# Altium footprint library Miscellaneous Devices LC.PcbLib: 733 footprints (part 46 of 46)
Each footprint in its own frame and in the unit in brackets; x right, y up, seen from the top. Pads: shape width x height; smd on the part's side, far side on the other; paste and mask are expansions set on the pad; w line width, h text height; cw(c..) or ccw(c..) is an arc to the next point about the centre after c.
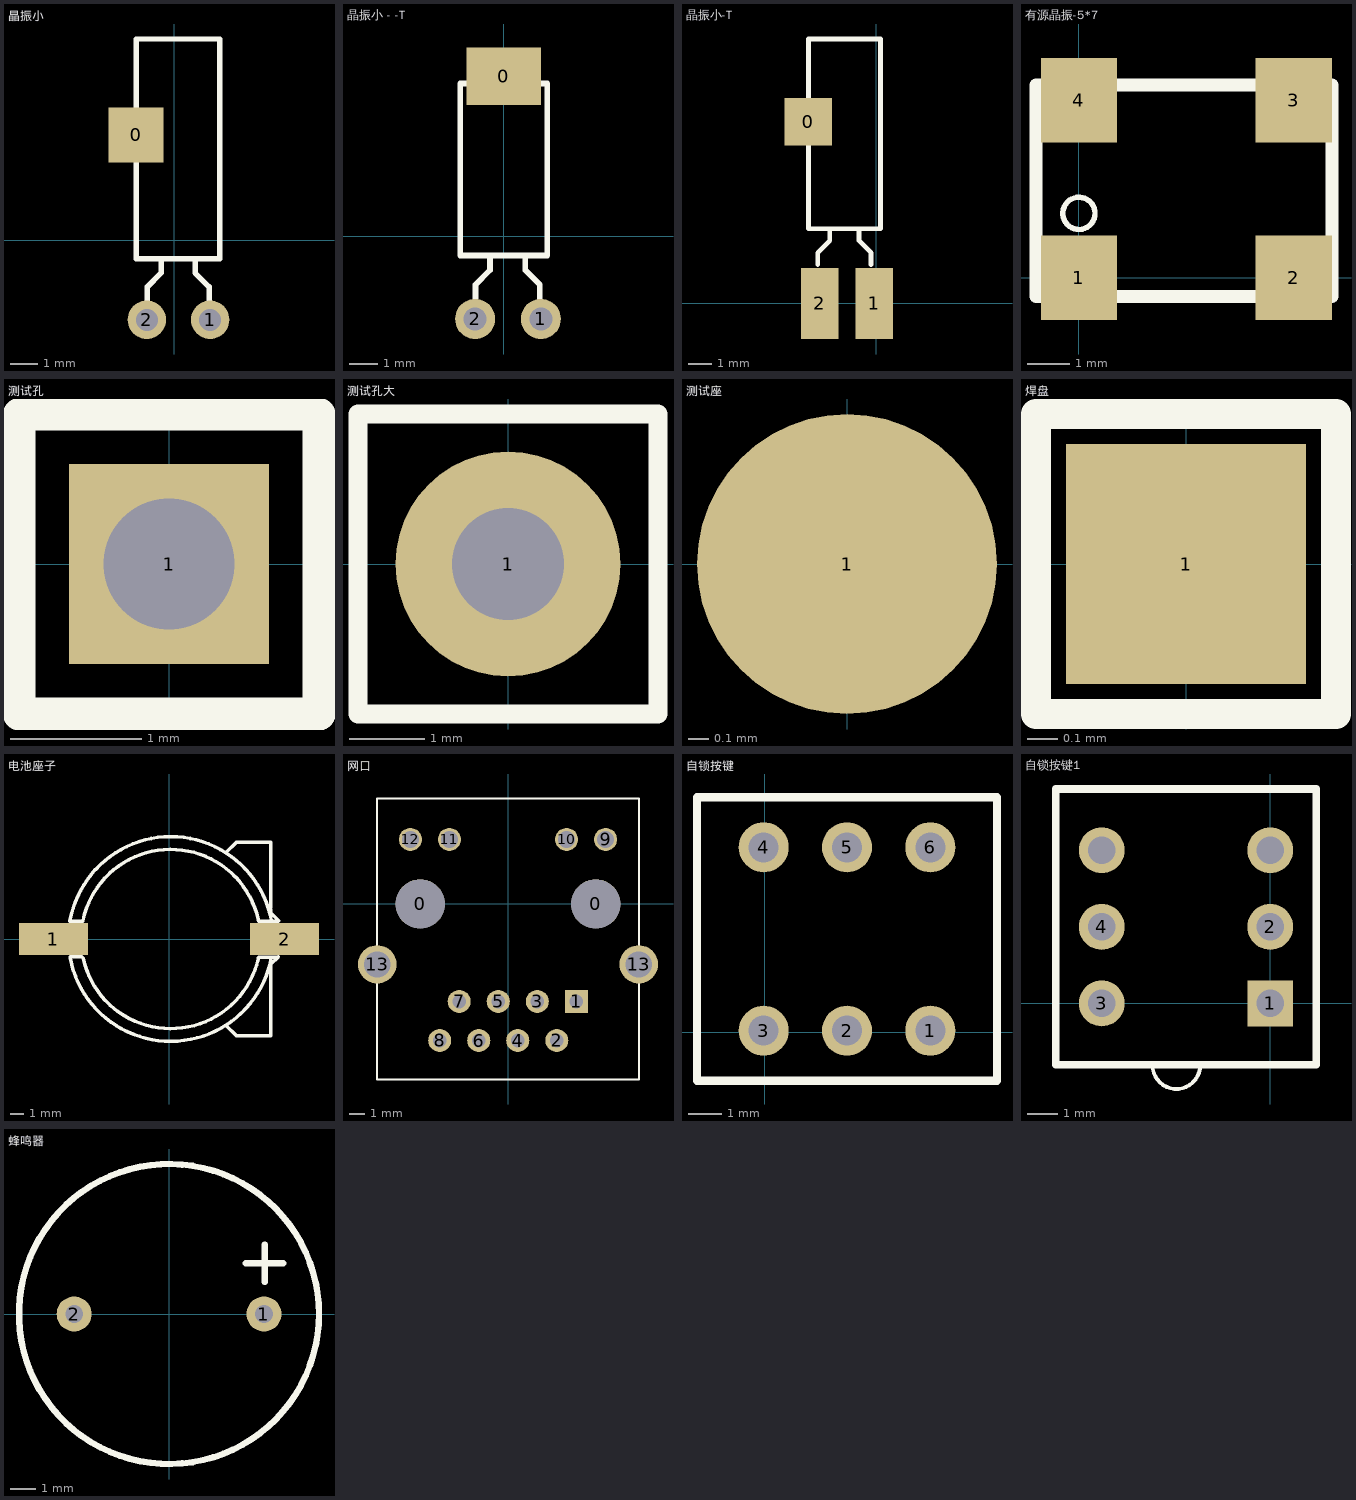
[diagram p45: the footprints below, top view; thin cyan lines are the x and y axes]

## 晶振小 [mm]
pads (3):
  rect 2x2 smd: 0(-1.39,3.829)
  round 1.4 hole 0.8: 1(1.3,-2.9) 2(-1,-2.9)
Top Overlay:
  lines w0.2: -0.987,-2.184 -0.987,-1.7 -0.479,-1.192 -0.479,-0.682 ; 1.263,-2.184 1.263,-1.7 0.755,-1.192 0.755,-0.682 ; -0.479,-0.682 0.755,-0.682 ; -0.479,-0.682 -1.379,-0.682 -1.379,7.318 1.655,7.318 1.655,-0.682 0.755,-0.682

## 晶振小 - -T [mm]
pads (3):
  rect 2.6x2 smd: 0(0,5.588)
  round 1.4 hole 0.8: 1(1.3,-2.9) 2(-1,-2.9)
Top Overlay:
  lines w0.2: -0.987,-2.184 -0.987,-1.7 -0.479,-1.192 -0.479,-0.682 ; 1.263,-2.184 1.263,-1.7 0.755,-1.192 0.755,-0.682 ; -0.479,-0.682 -1.524,-0.682 -1.524,5.334 1.524,5.334 1.524,-0.682 0.755,-0.682 ; -0.479,-0.682 0.755,-0.682

## 晶振小-T [mm]
pads (3):
  rect 2x2 smd: 0(-2.875,7.655)
  rect 1.585x3 smd: 1(-0.094,-0.004) 2(-2.38,-0.004)
Top Overlay:
  lines w0.2: -2.471,1.641 -2.471,2.125 -1.963,2.633 -1.963,3.143 ; -0.221,1.641 -0.221,2.125 -0.729,2.633 -0.729,3.143 ; -1.963,3.143 -2.863,3.143 -2.863,11.143 0.171,11.143 0.171,3.143 -0.729,3.143 ; -1.963,3.143 -0.729,3.143

## 有源晶振-5*7 [mm]
pads (4):
  rect 1.8x2 smd: 1(0,0) 2(5.08,0) 3(5.08,4.2) 4(0,4.2)
Top Overlay:
  circle w0.127: c0,1.524 r0.381
  lines w0.305: -1.016,-0.445 -1.016,4.556 5.984,4.556 5.984,-0.445 -1.016,-0.445

## 测试孔 [mil]
pads (1):
  rect 60x60 hole 39.37: 1(0,0)
Top Overlay:
  lines w10: -45,-45 45,-45 45,45 -45,45 -45,-45

## 测试孔大 [mm]
pads (1):
  round 3 hole 1.5: 1(0,0)
Top Overlay:
  lines w0.254: -2,-2 -2,2 2,2 2,-2 -2,-2

## 测试座 [mm]
pads (1):
  round 1.5 smd: 1(0,0)

## 焊盘 [mm]
pads (1):
  rect 0.8x0.8 smd: 1(0,0)
Top Overlay:
  lines w0.1: -0.5,-0.5 0.5,-0.5 0.5,0.5 -0.5,0.5 -0.5,0 -0.5,-0.5

## 电池座子 [mm]
pads (2):
  rect 5x2.3 smd: 1(-8.375,0) 2(8.375,0)
Top Overlay:
  lines w0.254: 4.125,-6.25 4.875,-7 7.375,-7 7.375,-1.843 7.389,-1.829 ; 4.125,6.25 4.875,7 7.375,7 7.375,2.5 7.375,2.25 ; 7.225,1.301 7.924,1.301 7.925,1.3 ; 7.375,2.007 7.375,1.894 7.947,1.322 ; 7.375,2.108 7.388,2.108 ; 7.389,-1.854 7.389,-1.829 ; 7.427,-1.318 cw(c0.125,0) -7.163,-1.398 -7.163,-1.312 -7.15,-1.3 -6.33,-1.3 -6.22,-1.41 ccw(c0.125,0) 6.459,-1.462 6.459,-1.366 6.507,-1.318 7.9,-1.318 ; 7.918,-1.3 7.9,-1.318 ; 7.389,-1.829 7.9,-1.318 ; -7.18,1.301 cw(c0.125,0) 7.43,1.301 6.526,1.301 6.525,1.3 6.465,1.36 6.465,1.432 ccw(c0.125,0) -6.237,1.334 -6.27,1.301 -7.18,1.301

## 网口 [mm]
pads (16):
  round 3.2 hole 3.2: 0(-5.713,0) 0(5.713,0)
  rect 1.5x1.5 hole 0.9: 1(4.445,-6.35)
  round 1.5 hole 0.9: 2(3.176,-8.889) 3(1.905,-6.35) 4(0.634,-8.891) 5(-0.635,-6.35) 6(-1.904,-8.891) 7(-3.175,-6.35) 8(-4.444,-8.889)
  round 1.5 hole 1.1: 9(6.35,4.191) 10(3.81,4.191) 11(-3.81,4.191) 12(-6.35,4.191)
  round 2.5 hole 1.7: 13(-8.509,-3.937) 13(8.509,-3.937)
Top Overlay:
  lines w0.127: -6.35,4.191 -6.35,4.826 ; -3.81,3.683 -3.81,4.191 ; 0,-8.892 0.633,-8.892 0.635,-8.894 ; -8.509,-11.43 8.509,-11.43 8.509,-3.937 8.509,6.858 -8.509,6.858 -8.509,-3.937 -8.509,-11.43

## 自锁按键 [mm]
pads (6):
  round 1.5 hole 0.9: 1(4.97,0.048) 2(2.47,0.048) 3(-0.03,0.048) 4(-0.03,5.548) 5(2.47,5.548) 6(4.97,5.548)
Top Overlay:
  lines w0.254: 5.22,-1.452 -0.03,-1.452 ; -0.03,-1.452 5.47,-1.452 6.97,-1.452 6.97,-0.202 6.97,5.798 6.97,7.048 4.97,7.048 -0.03,7.048 -2.03,7.048 -2.03,-0.452 -2.03,-1.452 -0.03,-1.452

## 自锁按键1 [mm]
pads (6):
  rect 1.5x1.5 hole 0.9: 1(0,0)
  round 1.5 hole 0.9: 2(0,2.5) 3(-5.5,0) 4(-5.5,2.5) ""(-5.5,5) ""(0,5)
Top Overlay:
  lines w0.127: -3.842,-2 ccw(c-3.064,-2.016) -2.286,-2
  lines w0.254: 1.5,5.25 1.5,0 ; 1.5,0 1.5,5.5 1.5,7 0.25,7 -5.75,7 -7,7 -7,5 -7,0 -7,-2 -3.842,-2 0.5,-2 1.5,-2 1.5,0

## 蜂鸣器 [mm]
pads (2):
  round 1.4 hole 0.7: 1(3.797,0) 2(-3.797,0)
Top Overlay:
  circle w0.254: c-0.003,0 r6
  lines w0.254: 3.072,2.032 4.572,2.032 ; 3.822,1.282 3.822,2.782